# Altium footprint library 14-Inductors.PcbLib: 164 footprints (part 4 of 11)
Each footprint in its own frame and in the unit in brackets; x right, y up, seen from the top. Pads: shape width x height; smd on the part's side, far side on the other; paste and mask are expansions set on the pad; w line width, h text height; cw(c..) or ccw(c..) is an arc to the next point about the centre after c.
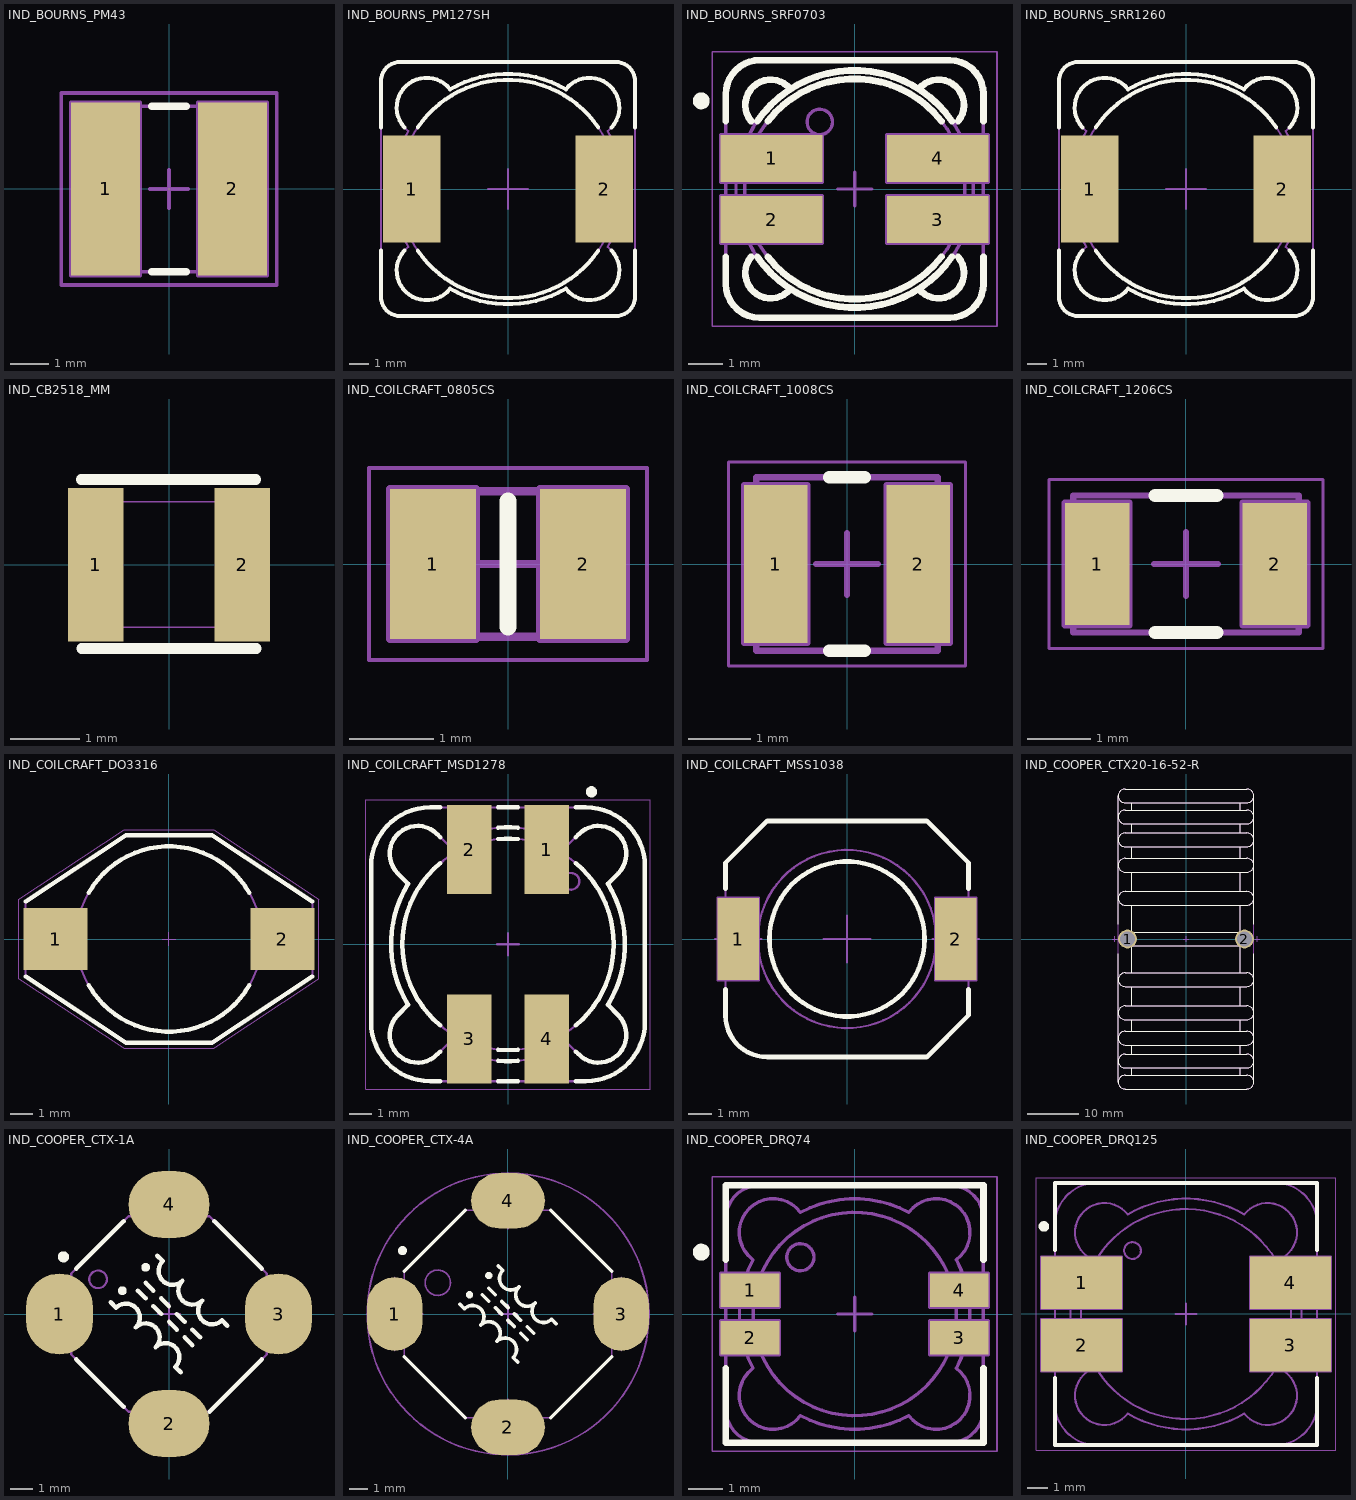
[diagram p3: the footprints below, top view; thin cyan lines are the x and y axes]

## IND_BOURNS_PM43 [mm] "SMD Inductor  Body Width 4.5mm Body Lenght 4mm Height 3.5mm"
height 3.5
pads (2):
  rect 1.8x4.5 smd: 1(-1.65,0) 2(1.65,0)
Top Overlay:
  lines w0.2: -0.45,-2.15 0.45,-2.15 ; -0.45,2.15 0.45,2.15
Mechanical 8:
  lines w0.1: -2.15,0 -1.65,0 ; -1.65,-0.5 -1.65,0 ; -1.65,0.5 -1.65,0 ; -1.15,0 -1.65,0 ; -0.5,0 0,0 ; 0,-0.5 0,0 ; 0,0.5 0,0 ; 0.5,0 0,0 ; 1.15,0 1.65,0 ; 1.65,-0.5 1.65,0 ; 1.65,0.5 1.65,0 ; 2.15,0 1.65,0 ; -2.55,-2.25 -0.75,-2.25 -0.75,2.25 -2.55,2.25 -2.55,-2.25 ; 0.75,-2.25 2.55,-2.25 2.55,2.25 0.75,2.25 0.75,-2.25
Mechanical 14:
  lines w0.1: -0.75,-2.15 -0.75,2.15 ; 0.75,-2.15 0.75,2.15 ; -2.381,-0.3 ccw(c0,0) -1.067,-2.15 1.067,-2.15 ccw(c0,0) 2.381,-0.3 2.1,-0.3 cw(c2.1,0) 2.1,0.3 2.381,0.3 ccw(c0,0) 1.067,2.15 -1.067,2.15 ccw(c0,0) -2.381,0.3 -2.1,0.3 cw(c-2.1,0) -2.1,-0.3 -2.381,-0.3
Mechanical 15:
  lines w0.1: -2.8,-2.5 -2.8,2.5 2.8,2.5 2.8,-2.5 -2.8,-2.5
3D body "IND_BOURNS_PM43.stp": height 3.5, standoff 0, extent -2.381,-2.15 2.381,2.15

## IND_BOURNS_PM127SH [mm] "SMD Inductor  Body Width 12.5mm Body Lenght 12.5mm Height 8mm"
height 8
pads (2):
  rect 2.9x5.4 smd: 1(-4.85,0) 2(4.85,0)
Top Overlay:
  lines w0.2: -6.4,-3.1 -6.4,-5.4 ccw(c-5.4,-5.4) -5.4,-6.4 5.4,-6.4 ccw(c5.4,-5.4) 6.4,-5.4 6.4,-3.1 ; -6.4,3.1 -6.4,5.4 cw(c-5.4,5.4) -5.4,6.4 5.4,6.4 cw(c5.4,5.4) 6.4,5.4 6.4,3.1 ; -5.218,-3.1 ccw(c-4.101,-4.101) -2.912,-5.016 ccw(c0,0) 2.912,-5.016 ccw(c4.101,-4.101) 5.218,-3.1 ; -5.218,3.1 cw(c-4.101,4.101) -2.912,5.016 cw(c0,0) 2.912,5.016 cw(c4.101,4.101) 5.218,3.1 ; -4.543,-3.1 ccw(c0,0) 4.543,-3.1 ; -4.543,3.1 cw(c0,0) 4.543,3.1
Mechanical 8:
  lines w0.1: -5.85,0 -4.85,0 ; -4.85,-1 -4.85,0 ; -4.85,1 -4.85,0 ; -3.85,0 -4.85,0 ; -1,0 0,0 ; 0,-1 0,0 ; 0,1 0,0 ; 1,0 0,0 ; 3.85,0 4.85,0 ; 4.85,-1 4.85,0 ; 4.85,1 4.85,0 ; 5.85,0 4.85,0
Mechanical 14:
  circle w0.1: c0,0 r5.5
  lines w0.1: -6.4,-5.4 ccw(c-5.4,-5.4) -5.4,-6.4 5.4,-6.4 ccw(c5.4,-5.4) 6.4,-5.4 6.4,5.4 ccw(c5.4,5.4) 5.4,6.4 -5.4,6.4 ccw(c-5.4,5.4) -6.4,5.4 -6.4,-5.4 ; -5.016,-2.912 cw(c0,0) -5.016,2.912 cw(c-4.101,4.101) -2.912,5.016 cw(c0,0) 2.912,5.016 cw(c4.101,4.101) 5.016,2.912 cw(c0,0) 5.016,-2.912 cw(c4.101,-4.101) 2.912,-5.016 cw(c0,0) -2.912,-5.016 cw(c-4.101,-4.101) -5.016,-2.912
3D body "IND_BOURNS_PM127SH.stp": height 8, standoff 0, extent -6.4,-6.4 6.4,6.4

## IND_BOURNS_SRF0703 [mm] "SMD Inductor  Body Width 7.6mm Body Lenght 7.6mm Height 3.6mm"
height 3.6
pads (4):
  rect 3x1.4 smd: 1(-2.45,0.9) 2(-2.45,-0.9) 3(2.45,-0.9) 4(2.45,0.9)
Top Overlay:
  circle w0.25: c-4.525,2.6 r0.125
  lines w0.2: -3.8,-2 -3.8,-2.8 ccw(c-2.8,-2.8) -2.8,-3.8 2.8,-3.8 ccw(c2.8,-2.8) 3.8,-2.8 3.8,-2 ; -3.8,2 -3.8,2.8 cw(c-2.8,2.8) -2.8,3.8 2.8,3.8 cw(c2.8,2.8) 3.8,2.8 3.8,2 ; -3.055,-2 ccw(c-2.475,-2.475) -1.891,-2.945 ; -3.055,2 cw(c-2.475,2.475) -1.891,2.945 ; -2.872,-2 ccw(c0,0) 2.872,-2 ; -2.872,2 cw(c0,0) 2.872,2 ; -2.562,-2 ccw(c0,0) 2.562,-2 ; -2.562,2 cw(c0,0) 2.562,2 ; 1.891,-2.945 ccw(c2.475,-2.475) 3.055,-2 ; 1.891,2.945 cw(c2.475,2.475) 3.055,2
Mechanical 8:
  lines w0.1: -2.95,-0.9 -2.45,-0.9 ; -2.95,0.9 -2.45,0.9 ; -2.45,-1.4 -2.45,-0.9 ; -2.45,-0.4 -2.45,-0.9 ; -2.45,0.4 -2.45,0.9 ; -2.45,1.4 -2.45,0.9 ; -1.95,-0.9 -2.45,-0.9 ; -1.95,0.9 -2.45,0.9 ; -0.5,0 0,0 ; 0,-0.5 0,0 ; 0,0.5 0,0 ; 0.5,0 0,0 ; 1.95,-0.9 2.45,-0.9 ; 1.95,0.9 2.45,0.9 ; 2.45,-1.4 2.45,-0.9 ; 2.45,-0.4 2.45,-0.9 ; 2.45,0.4 2.45,0.9 ; 2.45,1.4 2.45,0.9 ; 2.95,-0.9 2.45,-0.9 ; 2.95,0.9 2.45,0.9 ; -3.95,-1.6 -0.95,-1.6 -0.95,-0.2 -3.95,-0.2 -3.95,-1.6 ; -3.95,0.2 -0.95,0.2 -0.95,1.6 -3.95,1.6 -3.95,0.2 ; 0.95,-1.6 0.95,-0.2 3.95,-0.2 3.95,-1.6 0.95,-1.6 ; 0.95,0.2 0.95,1.6 3.95,1.6 3.95,0.2 0.95,0.2
Mechanical 14:
  circle w0.1: c0,0 r3.5
  circle w0.1: c0,0 r3.25
  circle w0.1: c-1.028,1.978 r0.375
  lines w0.1: -2.945,-1.891 ccw(c-2.475,-2.475) -1.891,-2.945 ; -2.945,1.891 cw(c-2.475,2.475) -1.891,2.945 ; 1.891,-2.945 ccw(c2.475,-2.475) 2.945,-1.891 ; 1.891,2.945 cw(c2.475,2.475) 2.945,1.891 ; -3.8,-2.8 ccw(c-2.8,-2.8) -2.8,-3.8 2.8,-3.8 ccw(c2.8,-2.8) 3.8,-2.8 3.8,2.8 ccw(c2.8,2.8) 2.8,3.8 -2.8,3.8 ccw(c-2.8,2.8) -3.8,2.8 -3.8,-2.8
Mechanical 15:
  lines w0.05: -4.2,-4.05 -4.2,4.05 4.2,4.05 4.2,-4.05 -4.2,-4.05
3D body "IND_BOURNS_SRF0703.stp": height 3.6, standoff 0, extent -3.8,-3.8 3.8,3.8

## IND_BOURNS_SRR1260 [mm] "SMD Inductor  Body Width 12.5mm Body Lenght 12.5mm Height 6.5mm"
height 6.5
pads (2):
  rect 2.9x5.4 smd: 1(-4.85,0) 2(4.85,0)
Top Overlay:
  lines w0.2: -6.4,-3.1 -6.4,-5.4 ccw(c-5.4,-5.4) -5.4,-6.4 5.4,-6.4 ccw(c5.4,-5.4) 6.4,-5.4 6.4,-3.1 ; -6.4,3.1 -6.4,5.4 cw(c-5.4,5.4) -5.4,6.4 5.4,6.4 cw(c5.4,5.4) 6.4,5.4 6.4,3.1 ; -5.218,-3.1 ccw(c-4.101,-4.101) -2.912,-5.016 ccw(c0,0) 2.912,-5.016 ccw(c4.101,-4.101) 5.218,-3.1 ; -5.218,3.1 cw(c-4.101,4.101) -2.912,5.016 cw(c0,0) 2.912,5.016 cw(c4.101,4.101) 5.218,3.1 ; -4.543,-3.1 ccw(c0,0) 4.543,-3.1 ; -4.543,3.1 cw(c0,0) 4.543,3.1
Mechanical 8:
  lines w0.1: -5.85,0 -4.85,0 ; -4.85,-1 -4.85,0 ; -4.85,1 -4.85,0 ; -3.85,0 -4.85,0 ; -1,0 0,0 ; 0,-1 0,0 ; 0,1 0,0 ; 1,0 0,0 ; 3.85,0 4.85,0 ; 4.85,-1 4.85,0 ; 4.85,1 4.85,0 ; 5.85,0 4.85,0
Mechanical 14:
  circle w0.1: c0,0 r5.5
  lines w0.1: -6.4,-5.4 ccw(c-5.4,-5.4) -5.4,-6.4 5.4,-6.4 ccw(c5.4,-5.4) 6.4,-5.4 6.4,5.4 ccw(c5.4,5.4) 5.4,6.4 -5.4,6.4 ccw(c-5.4,5.4) -6.4,5.4 -6.4,-5.4 ; -5.016,-2.912 ccw(c-4.101,-4.101) -2.912,-5.016 ccw(c0,0) 2.912,-5.016 ccw(c4.101,-4.101) 5.016,-2.912 ccw(c0,0) 5.016,2.912 ccw(c4.101,4.101) 2.912,5.016 ccw(c0,0) -2.912,5.016 ccw(c-4.101,4.101) -5.016,2.912 ccw(c0,0) -5.016,-2.912
3D body "IND_BOURNS_SRR1260.stp": height 6.5, standoff 0, extent -6.4,-6.4 6.4,6.4

## IND_CB2518_MM [mm] "IND_CB2518_MM"
height 6.5
pads (2):
  rect 0.8x2.2 smd: 1(-1.05,0) 2(1.05,0)
Top Overlay:
  lines w0.152: -1.255,1.219 1.245,1.219 ; -1.25,-1.203 1.25,-1.203
Mechanical 16:
  lines w0.025: -1.25,-0.9 -1.25,0.9 1.25,0.9 1.25,-0.9 -1.25,-0.9
3D body "ind_cb2518_mmpad.stp": height 0.01, standoff 0, extent -1.441,-1.1 -0.641,1.1
3D body "ind_cb2518_mmpad.stp": height 0.01, standoff 0, extent 0.667,-1.1 1.467,1.1
3D body "ind_cb2518_mm.stp": height 0.85, standoff 0, extent -1.25,-0.9 1.25,0.9

## IND_COILCRAFT_0805CS [mm] "SMD Inductor  Body Width 1.73mm Body Lenght 2.29mm Height 1.52mm, 0805CS Serie"
height 1.52
pads (2):
  rect 1.02x1.78 smd: 1(-0.89,0) 2(0.89,0)
Top Overlay:
  lines w0.2: 0,-0.75 0,0.75
Mechanical 8:
  lines w0.1: -1.39,0 -0.89,0 ; -0.89,-0.5 -0.89,0 ; -0.89,0.5 -0.89,0 ; -0.5,0 0,0 ; -0.39,0 -0.89,0 ; 0,-0.5 0,0 ; 0,0.5 0,0 ; 0.39,0 0.89,0 ; 0.5,0 0,0 ; 0.89,-0.5 0.89,0 ; 0.89,0.5 0.89,0 ; 1.39,0 0.89,0 ; -1.4,-0.89 -0.38,-0.89 -0.38,0.89 -1.4,0.89 -1.4,-0.89 ; 0.38,-0.89 1.4,-0.89 1.4,0.89 0.38,0.89 0.38,-0.89
Mechanical 14:
  lines w0.1: -1.145,-0.863 -1.145,0.863 1.145,0.863 1.145,-0.863 -1.145,-0.863
Mechanical 15:
  lines w0.05: -1.65,-1.14 1.65,-1.14 1.65,1.14 -1.65,1.14 -1.65,-1.14
3D body "IND_COILCRAFT_0805CS.stp": height 1.52, standoff 0, extent -1.144,-0.862 1.145,0.863

## IND_COILCRAFT_1008CS [mm] "SMD Inductor  Body Width 2.79m Body Lenght 2.92mm Height 2.03mm"
height 2.03
pads (2):
  rect 1.02x2.54 smd: 1(-1.145,0) 2(1.145,0)
Top Overlay:
  lines w0.2: -0.285,-1.395 0.285,-1.395 ; -0.285,1.395 0.285,1.395
Mechanical 8:
  lines w0.1: -1.645,0 -1.145,0 ; -1.145,-0.5 -1.145,0 ; -1.145,0.5 -1.145,0 ; -0.645,0 -1.145,0 ; -0.5,0 0,0 ; 0,-0.5 0,0 ; 0,0.5 0,0 ; 0.5,0 0,0 ; 0.645,0 1.145,0 ; 1.145,-0.5 1.145,0 ; 1.145,0.5 1.145,0 ; 1.645,0 1.145,0 ; -1.655,-1.27 -0.635,-1.27 -0.635,1.27 -1.655,1.27 -1.655,-1.27 ; 0.635,-1.27 1.655,-1.27 1.655,1.27 0.635,1.27 0.635,-1.27
Mechanical 14:
  lines w0.1: -1.46,-1.395 -1.46,1.395 1.46,1.395 1.46,-1.395 -1.46,-1.395
Mechanical 15:
  lines w0.05: -1.905,-1.645 1.905,-1.645 1.905,1.645 -1.905,1.645 -1.905,-1.645
3D body "IND_COILCRAFT_1008CS.stp": height 2.18, standoff 0, extent -1.46,-1.395 1.46,1.395

## IND_COILCRAFT_1206CS [mm] "SMD Inductor  Body Width 2.16mm Body Lenght 3.56mm Height 1.52mm, 1206CS Serie"
height 1.52
pads (2):
  rect 1.02x1.93 smd: 1(-1.4,0) 2(1.4,0)
Top Overlay:
  lines w0.2: -0.49,-1.08 0.49,-1.08 ; -0.49,1.08 0.49,1.08
Mechanical 8:
  lines w0.1: -1.9,0 -1.4,0 ; -1.4,-0.5 -1.4,0 ; -1.4,0.5 -1.4,0 ; -0.9,0 -1.4,0 ; -0.5,0 0,0 ; 0,-0.5 0,0 ; 0,0.5 0,0 ; 0.5,0 0,0 ; 0.9,0 1.4,0 ; 1.4,-0.5 1.4,0 ; 1.4,0.5 1.4,0 ; 1.9,0 1.4,0 ; -1.91,-0.965 -1.91,0.965 -0.89,0.965 -0.89,-0.965 -1.91,-0.965 ; 0.89,-0.965 0.89,0.965 1.91,0.965 1.91,-0.965 0.89,-0.965
Mechanical 14:
  lines w0.1: -1.78,-1.08 -1.78,1.08 1.78,1.08 1.78,-1.08 -1.78,-1.08
Mechanical 15:
  lines w0.05: -2.16,-1.33 -2.16,1.33 2.16,1.33 2.16,-1.33 -2.16,-1.33
3D body "IND_COILCRAFT_1206CS.stp": height 1.51, standoff 0, extent -1.78,-1.08 1.78,1.08

## IND_COILCRAFT_DO3316 [mm] "SMD Inductor  Body Width 9.4mm Body Lenght 12.95mm Height 5.21mm"
height 5.21
pads (2):
  rect 2.92x2.79 smd: 1(-5.145,0) 2(5.145,0)
Top Overlay:
  lines w0.2: -6.5,-1.7 -1.95,-4.7 1.95,-4.7 6.5,-1.7 ; -6.5,1.7 -1.95,4.7 1.95,4.7 6.5,1.7 ; -3.637,-2.1 ccw(c0,0) 3.637,-2.1 ; -3.637,2.1 cw(c0,0) 3.637,2.1
Mechanical 14:
  circle w0.1: c0,0 r4.2
  lines w0.1: -6.5,-1.7 -6.5,1.7 -1.95,4.7 1.95,4.7 6.5,1.7 6.5,-1.7 1.95,-4.7 -1.95,-4.7 -6.5,-1.7
Mechanical 15:
  lines w0.05: -0.3,0 0.3,0 ; 0,-0.3 0,0.3 ; -6.8,-1.802 -6.8,1.802 -2.025,4.95 2.025,4.95 6.8,1.802 6.8,-1.802 2.025,-4.95 -2.025,-4.95 -6.8,-1.802
3D body "IND_COILCRAFT_DO3316.stp": height 5.2, standoff 0, extent -6.475,-4.7 6.475,4.7

## IND_COILCRAFT_MSD1278 [mm] "SMD Inductor  Body Width 12.3mm Body Lenght 12.3mm Height 8.05mm"
height 8.05
pads (4):
  rect 2x4 smd: 1(1.75,4.25) 2(-1.75,4.25) 3(-1.75,-4.25) 4(1.75,-4.25)
Top Overlay:
  circle w0.25: c3.75,6.85 r0.125
  lines w0.2: -3.05,-6.15 -3.5,-6.15 cw(c-3.5,-3.5) -6.15,-3.5 -6.15,3.5 cw(c-3.5,3.5) -3.5,6.15 -3.05,6.15 ; -3.05,-4.818 -3.182,-4.95 cw(c-4.066,-4.066) -4.95,-3.182 -4.489,-2.722 cw(c0,0) -4.489,2.722 -4.95,3.182 cw(c-4.066,4.066) -3.182,4.95 -3.05,4.818 ; -3.05,-3.641 cw(c0,0) -3.05,3.641 ; -0.45,-6.15 0.45,-6.15 ; -0.45,-5.231 ccw(c0,0) 0.45,-5.231 ; -0.45,-4.729 ccw(c0,0) 0.45,-4.729 ; -0.45,4.729 cw(c0,0) 0.45,4.729 ; -0.45,5.231 cw(c0,0) 0.45,5.231 ; -0.45,6.15 0.45,6.15 ; 3.05,-6.15 3.5,-6.15 ccw(c3.5,-3.5) 6.15,-3.5 6.15,3.5 ccw(c3.5,3.5) 3.5,6.15 3.05,6.15 ; 3.05,-4.818 3.182,-4.95 ccw(c4.066,-4.066) 4.95,-3.182 4.489,-2.722 ccw(c0,0) 4.489,2.722 4.95,3.182 ccw(c4.066,4.066) 3.182,4.95 3.05,4.818 ; 3.05,-3.641 ccw(c0,0) 3.05,3.641
Mechanical 8:
  lines w0.1: -2.25,-4.25 -1.75,-4.25 ; -2.25,4.25 -1.75,4.25 ; -1.75,-4.75 -1.75,-4.25 ; -1.75,-3.75 -1.75,-4.25 ; -1.75,3.75 -1.75,4.25 ; -1.75,4.75 -1.75,4.25 ; -1.25,-4.25 -1.75,-4.25 ; -1.25,4.25 -1.75,4.25 ; -0.5,0 0,0 ; 0,-0.5 0,0 ; 0,0.5 0,0 ; 0.5,0 0,0 ; 1.25,-4.25 1.75,-4.25 ; 1.25,4.25 1.75,4.25 ; 1.75,-4.75 1.75,-4.25 ; 1.75,-3.75 1.75,-4.25 ; 1.75,3.75 1.75,4.25 ; 1.75,4.75 1.75,4.25 ; 2.25,-4.25 1.75,-4.25 ; 2.25,4.25 1.75,4.25
Mechanical 14:
  circle w0.1: c0,0 r4.75
  circle w0.1: c2.828,2.828 r0.375
  lines w0.1: -6.15,-3.5 ccw(c-3.5,-3.5) -3.5,-6.15 3.5,-6.15 ccw(c3.5,-3.5) 6.15,-3.5 6.15,3.5 ccw(c3.5,3.5) 3.5,6.15 -3.5,6.15 ccw(c-3.5,3.5) -6.15,3.5 -6.15,-3.5 ; -4.95,-3.182 ccw(c-4.066,-4.066) -3.182,-4.95 -2.722,-4.489 ccw(c0,0) 2.722,-4.489 3.182,-4.95 ccw(c4.066,-4.066) 4.95,-3.182 4.489,-2.722 ccw(c0,0) 4.489,2.722 4.95,3.182 ccw(c4.066,4.066) 3.182,4.95 2.722,4.489 ccw(c0,0) -2.722,4.489 -3.182,4.95 ccw(c-4.066,4.066) -4.95,3.182 -4.489,2.722 ccw(c0,0) -4.489,-2.722 -4.95,-3.182
Mechanical 15:
  lines w0.05: -6.4,-6.5 6.4,-6.5 6.4,6.5 -6.4,6.5 -6.4,-6.5
3D body "IND_COILCRAFT_MSD1278.stp": height 8.05, standoff 0, extent -6.15,-6.15 6.15,6.15

## IND_COILCRAFT_MSS1038 [mm] "SMD Inductor  Body Width 10mm Body Lenght 10.2mm Height 4mm"
height 4
pads (2):
  rect 1.78x3.56 smd: 1(-4.7,0) 2(4.7,0)
Top Overlay:
  circle w0.2: c0,0 r3.35
  lines w0.2: -5.25,-2.18 -5.25,-3.3 ccw(c-3.45,-3.3) -3.45,-5.1 3.45,-5.1 5.25,-3.3 5.25,-2.18 ; -5.25,2.18 -5.25,3.3 -3.45,5.1 3.45,5.1 5.25,3.3 5.25,2.18
Mechanical 8:
  lines w0.1: -5.7,0 -4.7,0 ; -4.7,-1 -4.7,0 ; -4.7,1 -4.7,0 ; -3.7,0 -4.7,0 ; -1,0 0,0 ; 0,-1 0,0 ; 0,1 0,0 ; 1,0 0,0 ; 3.7,0 4.7,0 ; 4.7,-1 4.7,0 ; 4.7,1 4.7,0 ; 5.7,0 4.7,0 ; -5.59,-1.78 -3.81,-1.78 -3.81,1.78 -5.59,1.78 -5.59,-1.78 ; 3.81,-1.78 5.59,-1.78 5.59,1.78 3.81,1.78 3.81,-1.78
Mechanical 14:
  circle w0.1: c0,0 r3.85
  circle w0.1: c0,0 r3.35
  lines w0.1: -5.25,-1.6 -5.25,1.6 ; -5.25,-1.6 -5.25,-3.3 ccw(c-3.45,-3.3) -3.45,-5.1 3.45,-5.1 5.25,-3.3 5.25,-1.6 ; -5.25,-1.6 -3.85,-1.6 -3.85,1.6 -5.25,1.6 ; -5.25,1.6 -5.25,3.3 -3.45,5.1 3.45,5.1 5.25,3.3 5.25,1.6 ; 5.25,-1.6 5.25,1.6 ; 5.25,-1.6 3.85,-1.6 3.85,1.6 5.25,1.6
3D body "IND_COILCRAFT_MSS1038.stp": height 4, standoff 0, extent -5.25,-5.1 5.25,5.1

## IND_COOPER_CTX20-16-52-R [mm] "Vertical Leaded Toroidal Inductor Lead Spacing 23mm D59mm x W28mm"
height 59
pads (2):
  round 3.7 hole 3: 1(-11.5,0) 2(11.5,0)
Top Overlay:
  lines w0.2: -13.325,-28.15 -13.325,-2.923 ; -13.325,2.923 -13.325,28.15 ; -11.321,-1.35 11.321,-1.35 ; -11.321,1.35 11.321,1.35 ; -10.625,-26.8 -10.625,-25.35 ; -10.625,-22.65 -10.625,-20.85 ; -10.625,-18.15 -10.625,-15.85 ; -10.625,-13.15 -10.625,-9.35 ; -10.625,-6.65 -10.625,-1.35 ; -10.625,1.35 -10.625,6.65 ; -10.625,9.35 -10.625,13.15 ; -10.625,15.85 -10.625,18.15 ; -10.625,20.85 -10.625,22.65 ; -10.625,25.35 -10.625,26.8 ; 10.625,-26.8 10.625,-25.35 ; 10.625,-22.65 10.625,-20.85 ; 10.625,-18.15 10.625,-15.85 ; 10.625,-13.15 10.625,-9.35 ; 10.625,-6.65 10.625,-1.35 ; 10.625,1.35 10.625,6.65 ; 10.625,9.35 10.625,13.15 ; 10.625,15.85 10.625,18.15 ; 10.625,20.85 10.625,22.65 ; 10.625,25.35 10.625,26.8 ; 13.325,-28.15 13.325,-2.923 ; 13.325,2.923 13.325,28.15 ; -11.975,-29.5 cw(c-11.975,-28.15) -11.975,-26.8 11.975,-26.8 cw(c11.975,-28.15) 11.975,-29.5 -11.975,-29.5 ; -11.975,-25.35 cw(c-11.975,-24) -11.975,-22.65 11.975,-22.65 cw(c11.975,-24) 11.975,-25.35 -11.975,-25.35 ; -11.975,-20.85 cw(c-11.975,-19.5) -11.975,-18.15 11.975,-18.15 cw(c11.975,-19.5) 11.975,-20.85 -11.975,-20.85 ; -11.975,-15.85 cw(c-11.975,-14.5) -11.975,-13.15 11.975,-13.15 cw(c11.975,-14.5) 11.975,-15.85 -11.975,-15.85 ; -11.975,-9.35 cw(c-11.975,-8) -11.975,-6.65 11.975,-6.65 cw(c11.975,-8) 11.975,-9.35 -11.975,-9.35 ; -11.975,6.65 cw(c-11.975,8) -11.975,9.35 11.975,9.35 cw(c11.975,8) 11.975,6.65 -11.975,6.65 ; -11.975,13.15 cw(c-11.975,14.5) -11.975,15.85 11.975,15.85 cw(c11.975,14.5) 11.975,13.15 -11.975,13.15 ; -11.975,18.15 cw(c-11.975,19.5) -11.975,20.85 11.975,20.85 cw(c11.975,19.5) 11.975,18.15 -11.975,18.15 ; -11.975,22.65 cw(c-11.975,24) -11.975,25.35 11.975,25.35 cw(c11.975,24) 11.975,22.65 -11.975,22.65 ; -11.975,26.8 cw(c-11.975,28.15) -11.975,29.5 11.975,29.5 cw(c11.975,28.15) 11.975,26.8 -11.975,26.8
Mechanical 8:
  lines w0.1: -14.5,0 -14,0 ; -14,-0.5 -14,0 ; -14,0.5 -14,0 ; -13.5,0 -14,0 ; -0.5,0 0,0 ; 0,-0.5 0,0 ; 0,0.5 0,0 ; 0.5,0 0,0 ; 13.5,0 14,0 ; 14,-0.5 14,0 ; 14,0.5 14,0 ; 14.5,0 14,0
Mechanical 14:
  lines w0.1: -13.325,-28.15 -13.325,28.15 ; -10.625,-26.8 -10.625,-25.35 ; -10.625,-22.65 -10.625,-20.85 ; -10.625,-18.15 -10.625,-15.85 ; -10.625,-13.15 -10.625,-9.35 ; -10.625,-6.65 -10.625,-1.35 ; -10.625,1.35 -10.625,6.65 ; -10.625,9.35 -10.625,13.15 ; -10.625,15.85 -10.625,18.15 ; -10.625,20.85 -10.625,22.65 ; -10.625,25.35 -10.625,26.8 ; 10.625,-26.8 10.625,-25.35 ; 10.625,-22.65 10.625,-20.85 ; 10.625,-18.15 10.625,-15.85 ; 10.625,-13.15 10.625,-9.35 ; 10.625,-6.65 10.625,-1.35 ; 10.625,1.35 10.625,6.65 ; 10.625,9.35 10.625,13.15 ; 10.625,15.85 10.625,18.15 ; 10.625,20.85 10.625,22.65 ; 10.625,25.35 10.625,26.8 ; 13.325,-28.15 13.325,28.15 ; -11.975,-29.5 cw(c-11.975,-28.15) -11.975,-26.8 11.975,-26.8 cw(c11.975,-28.15) 11.975,-29.5 -11.975,-29.5 ; -11.975,-25.35 cw(c-11.975,-24) -11.975,-22.65 11.975,-22.65 cw(c11.975,-24) 11.975,-25.35 -11.975,-25.35 ; -11.975,-20.85 cw(c-11.975,-19.5) -11.975,-18.15 11.975,-18.15 cw(c11.975,-19.5) 11.975,-20.85 -11.975,-20.85 ; -11.975,-15.85 cw(c-11.975,-14.5) -11.975,-13.15 11.975,-13.15 cw(c11.975,-14.5) 11.975,-15.85 -11.975,-15.85 ; -11.975,-9.35 cw(c-11.975,-8) -11.975,-6.65 11.975,-6.65 cw(c11.975,-8) 11.975,-9.35 -11.975,-9.35 ; -11.975,-1.35 cw(c-11.975,0) -11.975,1.35 11.975,1.35 cw(c11.975,0) 11.975,-1.35 -11.975,-1.35 ; -11.975,6.65 cw(c-11.975,8) -11.975,9.35 11.975,9.35 cw(c11.975,8) 11.975,6.65 -11.975,6.65 ; -11.975,13.15 cw(c-11.975,14.5) -11.975,15.85 11.975,15.85 cw(c11.975,14.5) 11.975,13.15 -11.975,13.15 ; -11.975,18.15 cw(c-11.975,19.5) -11.975,20.85 11.975,20.85 cw(c11.975,19.5) 11.975,18.15 -11.975,18.15 ; -11.975,22.65 cw(c-11.975,24) -11.975,25.35 11.975,25.35 cw(c11.975,24) 11.975,22.65 -11.975,22.65 ; -11.975,26.8 cw(c-11.975,28.15) -11.975,29.5 11.975,29.5 cw(c11.975,28.15) 11.975,26.8 -11.975,26.8
3D body "IND_COOPER_CTX20-16-52-R.stp": height 59, standoff -3.8, extent -14,-29.5 14,29.5

## IND_COOPER_CTX-1A [mm] "Dual Winding Shielded Power Inductor/Transformer CTX OCTA-PAC?PLUS Serie"
height 4.19
pads (4):
  oval 3.04x3.68 smd: 1(-4.98,0) 3(4.98,0)
  oval 3.68x3.04 smd: 2(0,-4.98) 4(0,4.98)
Top Overlay:
  circle w0.25: c-4.8,2.6 r0.125
  circle w0.2: c-2.121,1.061 r0.1
  circle w0.2: c-1.061,2.121 r0.1
  lines w0.2: -2.652,0.53 -2.408,0.286 cw(c-1.959,-0.163) -1.51,-0.612 cw(c-1.061,-1.061) -0.612,-1.51 cw(c-0.163,-1.959) 0.286,-2.408 0.53,-2.652 ; -1.414,1.061 -1.061,0.707 ; -1.061,1.414 -0.707,1.061 ; -0.707,0.354 -0.354,0 ; -0.53,2.652 -0.286,2.408 ccw(c0.163,1.959) 0.612,1.51 ccw(c1.061,1.061) 1.51,0.612 ccw(c1.959,0.163) 2.408,-0.286 2.652,-0.53 ; -0.354,0.707 0,0.354 ; 0,-0.354 0.354,-0.707 ; 0.354,0 0.707,-0.354 ; 0.707,-1.061 1.061,-1.414 ; 1.061,-0.707 1.414,-1.061 ; -4.225,2.06 -2.06,4.225 -4.225,2.06 ; -4.225,-2.06 -2.06,-4.225 -4.225,-2.06 ; 1.84,-4.445 4.225,-2.06 1.84,-4.445 ; 2.06,4.225 4.225,2.06 2.06,4.225
Mechanical 8:
  lines w0.1: -4.98,0 -4.98,-0.5 -4.98,0 ; -4.98,0 -4.48,0 -4.98,0 ; -4.98,0 -4.98,0.5 -4.98,0 ; -4.98,0 -5.48,0 -4.98,0 ; 0,-4.98 -0.5,-4.98 0,-4.98 ; 0,-4.98 0,-5.48 0,-4.98 ; 0,-4.98 0.5,-4.98 0,-4.98 ; 0,-4.98 0,-4.48 0,-4.98 ; 0,0 -0.5,0 0,0 ; 0,0 0,-0.5 0,0 ; 0,0 0.5,0 0,0 ; 0,0 0,0.5 0,0 ; 0,4.98 -0.5,4.98 0,4.98 ; 0,4.98 0,4.48 0,4.98 ; 0,4.98 0.5,4.98 0,4.98 ; 0,4.98 0,5.48 0,4.98 ; 4.98,0 4.98,-0.5 4.98,0 ; 4.98,0 5.48,0 4.98,0 ; 4.98,0 4.98,0.5 4.98,0 ; 4.98,0 4.48,0 4.98,0
Mechanical 14:
  circle w0.1: c-2.121,1.061 r0.1
  circle w0.1: c-1.061,2.121 r0.1
  circle w0.1: c-3.225,1.575 r0.4
  lines w0.1: -2.652,0.53 -2.408,0.286 cw(c-1.959,-0.163) -1.51,-0.612 cw(c-1.061,-1.061) -0.612,-1.51 cw(c-0.163,-1.959) 0.286,-2.408 0.53,-2.652 ; -1.414,1.061 -1.061,0.707 ; -1.061,1.414 -0.707,1.061 ; -0.707,0.354 -0.354,0 ; -0.53,2.652 -0.286,2.408 ccw(c0.163,1.959) 0.612,1.51 ccw(c1.061,1.061) 1.51,0.612 ccw(c1.959,0.163) 2.408,-0.286 2.652,-0.53 ; -0.354,0.707 0,0.354 ; 0,-0.354 0.354,-0.707 ; 0.354,0 0.707,-0.354 ; 0.707,-1.061 1.061,-1.414 ; 1.061,-0.707 1.414,-1.061 ; -5.715,-0.6 -5.715,0.6 ; -5.715,-0.6 -4.445,-0.6 ; -5.715,-0.6 -5.715,0.6 ; -5.715,-0.6 -4.445,-0.6 ; -5.715,0.6 -4.445,0.6 ; -5.715,0.6 -4.445,0.6 ; -4.445,-1.84 -1.84,-4.445 ; -4.445,-1.84 -4.445,1.84 ; -4.445,-1.84 -1.84,-4.445 ; -4.445,-1.84 -4.445,1.84 ; -4.445,-0.6 -4.445,0.6 ; -4.445,-0.6 -4.445,0.6 ; -4.445,1.84 -1.84,4.445 ; -4.445,1.84 -1.84,4.445 ; -1.84,-4.445 1.84,-4.445 ; -1.84,-4.445 1.84,-4.445 ; -1.84,4.445 1.84,4.445 ; -1.84,4.445 1.84,4.445 ; -0.6,-5.715 0.6,-5.715 ; -0.6,-5.715 -0.6,-4.445 ; -0.6,-5.715 0.6,-5.715 ; -0.6,-5.715 -0.6,-4.445 ; -0.6,-4.445 0.6,-4.445 ; -0.6,-4.445 0.6,-4.445 ; -0.6,4.445 -0.6,5.715 ; -0.6,4.445 0.6,4.445 ; -0.6,4.445 -0.6,5.715 ; -0.6,4.445 0.6,4.445 ; -0.6,5.715 0.6,5.715 ; -0.6,5.715 0.6,5.715 ; 0.6,-5.715 0.6,-4.445 ; 0.6,-5.715 0.6,-4.445 ; 0.6,4.445 0.6,5.715 ; 0.6,4.445 0.6,5.715 ; 1.84,-4.445 4.445,-1.84 ; 1.84,-4.445 4.445,-1.84 ; 1.84,4.445 4.445,1.84 ; 1.84,4.445 4.445,1.84 ; 4.445,-1.84 4.445,1.84 ; 4.445,-1.84 4.445,1.84 ; 4.445,-0.6 4.445,0.6 ; 4.445,-0.6 5.715,-0.6 ; 4.445,-0.6 4.445,0.6 ; 4.445,-0.6 5.715,-0.6 ; 4.445,0.6 5.715,0.6 ; 4.445,0.6 5.715,0.6 ; 5.715,-0.6 5.715,0.6 ; 5.715,-0.6 5.715,0.6
  text "1" at -3.825,-0.575 h1.2
  text "2" at -0.425,-4 h1.2
  text "4" at -0.425,2.75 h1.2
  text "3" at 3.225,-0.65 h1.2
3D body "IND_COOPER_CTX-1A.stp": height 4.19, standoff 0, extent -5.715,-5.715 5.715,5.715

## IND_COOPER_CTX-4A [mm] "Dual Winding Shielded Power Inductor/Transformer CTX OCTA-PAC?PLUS Serie"
height 6.35
pads (4):
  oval 3.05x4.06 smd: 1(-6.25,0) 3(6.25,0)
  oval 4.06x3.05 smd: 2(0,-6.25) 4(0,6.25)
Top Overlay:
  circle w0.2: c-1.061,2.121 r0.1
  circle w0.2: c-2.121,1.061 r0.1
  circle w0.25: c-5.825,3.5 r0.125
  lines w0.2: -5.722,-2.36 -2.36,-5.722 ; -5.722,2.36 -2.36,5.722 ; -2.652,0.53 -2.408,0.286 cw(c-1.959,-0.163) -1.51,-0.612 cw(c-1.061,-1.061) -0.612,-1.51 cw(c-0.163,-1.959) 0.286,-2.408 0.53,-2.652 ; -1.414,1.061 -1.061,0.707 ; -1.061,1.414 -0.707,1.061 ; -0.707,0.354 -0.354,0 ; -0.53,2.652 -0.286,2.408 ccw(c0.163,1.959) 0.612,1.51 ccw(c1.061,1.061) 1.51,0.612 ccw(c1.959,0.163) 2.408,-0.286 2.652,-0.53 ; -0.354,0.707 0,0.354 ; 0,-0.354 0.354,-0.707 ; 0.354,0 0.707,-0.354 ; 0.707,-1.061 1.061,-1.414 ; 1.061,-0.707 1.414,-1.061 ; 2.36,-5.722 5.722,-2.36 ; 2.36,5.722 5.722,2.36
Mechanical 8:
  lines w0.1: -7.775,0 -4.725,0 -6.25,0 ; -6.25,-2.03 -6.25,0 ; -6.25,2.03 -6.25,0 ; -2.03,6.25 0,6.25 ; -0.5,0 0,0 ; 0,-7.775 0,-6.25 ; 0,-4.725 0,-6.25 ; 0,-0.5 0,0 ; 0,0.5 0,0 ; 0,4.725 0,6.25 ; 0,7.775 0,6.25 ; 0.5,0 0,0 ; 2.03,-6.25 -2.03,-6.25 0,-6.25 ; 2.03,6.25 0,6.25 ; 4.725,0 6.25,0 ; 6.25,-2.03 6.25,0 ; 6.25,2.03 6.25,0 ; 7.775,0 6.25,0
Mechanical 14:
  circle w0.1: c-3.875,1.725 r0.7
  circle w0.1: c-1.061,2.121 r0.1
  circle w0.1: c-2.121,1.061 r0.1
  lines w0.1: -5.722,-1.18 -7.285,-1.18 -7.285,1.18 -5.722,1.18 ; -2.652,0.53 -2.408,0.286 cw(c-1.959,-0.163) -1.51,-0.612 cw(c-1.061,-1.061) -0.612,-1.51 cw(c-0.163,-1.959) 0.286,-2.408 0.53,-2.652 ; -1.414,1.061 -1.061,0.707 ; -1.18,-5.722 -1.18,-7.285 1.18,-7.285 1.18,-5.722 ; -1.18,5.722 -1.18,7.285 1.18,7.285 1.18,5.722 ; -1.061,1.414 -0.707,1.061 ; -0.707,0.354 -0.354,0 ; -0.53,2.652 -0.286,2.408 ccw(c0.163,1.959) 0.612,1.51 ccw(c1.061,1.061) 1.51,0.612 ccw(c1.959,0.163) 2.408,-0.286 2.652,-0.53 ; -0.354,0.707 0,0.354 ; 0,-0.354 0.354,-0.707 ; 0.354,0 0.707,-0.354 ; 0.707,-1.061 1.061,-1.414 ; 1.061,-0.707 1.414,-1.061 ; 5.722,-1.18 7.285,-1.18 7.285,1.18 5.722,1.18 ; -5.722,-2.36 -2.36,-5.722 2.36,-5.722 5.722,-2.36 5.722,2.36 2.36,5.722 -2.36,5.722 -5.722,2.36 -5.722,-2.36
  text "3" at 3.225,-0.65 h1.2
  text "4" at -0.425,2.75 h1.2
  text "2" at -0.425,-4 h1.2
  text "1" at -3.825,-0.575 h1.2
Mechanical 15:
  circle w0.1: c0,0 r7.775
3D body "IND_COOPER_CTX-4A.stp": height 6.35, standoff 0, extent -7.285,-7.285 7.285,7.285

## IND_COOPER_DRQ74 [mm] "Dual Winding Shielded Inductor/Transformer DRQ Serie"
height 4.45
pads (4):
  rect 1.73x1 smd: 1(-3.085,0.7) 2(-3.085,-0.7) 3(3.085,-0.7) 4(3.085,0.7)
Top Overlay:
  circle w0.25: c-4.525,1.825 r0.125
  lines w0.2: -3.8,-1.6 -3.8,-3.8 3.8,-3.8 3.8,-1.6 ; -3.8,1.6 -3.8,3.8 3.8,3.8 3.8,1.6
Mechanical 8:
  lines w0.1: -3.585,-0.7 -3.085,-0.7 ; -3.585,0.7 -3.085,0.7 ; -3.085,-1.2 -3.085,-0.7 ; -3.085,-0.2 -3.085,-0.7 ; -3.085,0.2 -3.085,0.7 ; -3.085,1.2 -3.085,0.7 ; -2.585,-0.7 -3.085,-0.7 ; -2.585,0.7 -3.085,0.7 ; -0.5,0 0,0 ; 0,-0.5 0,0 ; 0,0.5 0,0 ; 0.5,0 0,0 ; 2.585,-0.7 3.085,-0.7 ; 2.585,0.7 3.085,0.7 ; 3.085,-1.2 3.085,-0.7 ; 3.085,-0.2 3.085,-0.7 ; 3.085,0.2 3.085,0.7 ; 3.085,1.2 3.085,0.7 ; 3.585,-0.7 3.085,-0.7 ; 3.585,0.7 3.085,0.7 ; -3.95,-1.2 -3.95,-0.2 -2.22,-0.2 -2.22,-1.2 -3.95,-1.2 ; -3.95,0.2 -3.95,1.2 -2.22,1.2 -2.22,0.2 -3.95,0.2 ; 2.22,-1.2 2.22,-0.2 3.95,-0.2 3.95,-1.2 2.22,-1.2 ; 2.22,0.2 2.22,1.2 3.95,1.2 3.95,0.2 2.22,0.2
Mechanical 14:
  circle w0.1: c-1.6,1.675 r0.4
  circle w0.1: c0,0 r3
  lines w0.1: -3.8,-2.8 ccw(c-2.8,-2.8) -2.8,-3.8 2.8,-3.8 ccw(c2.8,-2.8) 3.8,-2.8 3.8,2.8 ccw(c2.8,2.8) 2.8,3.8 -2.8,3.8 ccw(c-2.8,2.8) -3.8,2.8 -3.8,-2.8 ; -3,-1.601 cw(c0,0) -3,1.601 cw(c-2.404,2.404) -1.601,3 cw(c0,0) 1.601,3 cw(c2.404,2.404) 3,1.601 cw(c0,0) 3,-1.601 cw(c2.404,-2.404) 1.601,-3 cw(c0,0) -1.601,-3 cw(c-2.404,-2.404) -3,-1.601
Mechanical 15:
  lines w0.05: -4.2,-4.05 4.2,-4.05 4.2,4.05 -4.2,4.05 -4.2,-4.05
3D body "IND_COOPER_DRQ74.stp": height 4.45, standoff 0, extent -3.8,-3.8 3.8,3.8

## IND_COOPER_DRQ125 [mm] "Dual Winding Shielded Inductor/Transformer DRQ Serie"
height 6
pads (4):
  rect 3.85x2.5 smd: 1(-4.975,1.5) 2(-4.975,-1.5) 3(4.975,-1.5) 4(4.975,1.5)
Top Overlay:
  circle w0.25: c-6.775,4.175 r0.125
  lines w0.2: -6.25,-3.05 -6.25,-6.25 6.25,-6.25 6.25,-3.05 ; -6.25,3.05 -6.25,6.25 6.25,6.25 6.25,3.05
Mechanical 8:
  lines w0.1: -5.475,-1.5 -4.975,-1.5 ; -5.475,1.5 -4.975,1.5 ; -4.975,-2 -4.975,-1.5 ; -4.975,-1 -4.975,-1.5 ; -4.975,1 -4.975,1.5 ; -4.975,2 -4.975,1.5 ; -4.475,-1.5 -4.975,-1.5 ; -4.475,1.5 -4.975,1.5 ; -0.5,0 0,0 ; 0,-0.5 0,0 ; 0,0.5 0,0 ; 0.5,0 0,0 ; 4.475,1.5 4.975,1.5 ; 4.975,1 4.975,1.5 ; 4.975,2 4.975,1.5 ; 5.475,1.5 4.975,1.5 ; -6.9,-2.75 -6.9,-0.25 -3.05,-0.25 -3.05,-2.75 -6.9,-2.75 ; -6.9,0.25 -6.9,2.75 -3.05,2.75 -3.05,0.25 -6.9,0.25 ; 3.05,-2.75 3.05,-0.25 6.9,-0.25 6.9,-2.75 3.05,-2.75 ; 3.05,0.25 3.05,2.75 6.9,2.75 6.9,0.25 3.05,0.25
Mechanical 14:
  circle w0.1: c-2.55,3.025 r0.4
  circle w0.1: c0,0 r5
  lines w0.1: -4.25,6.25 ccw(c-4.25,4.25) -6.25,4.25 -6.25,-4.25 ccw(c-4.25,-4.25) -4.25,-6.25 4.25,-6.25 ccw(c4.25,-4.25) 6.25,-4.25 6.25,4.25 ccw(c4.25,4.25) 4.25,6.25 ; -4.25,6.25 4.25,6.25 ; -4.25,6.25 4.25,6.25 ; -4.745,-2.781 cw(c0,0) -4.745,2.781 cw(c-3.889,3.889) -2.781,4.745 cw(c0,0) 2.781,4.745 cw(c3.889,3.889) 4.745,2.781 cw(c0,0) 4.745,-2.781 cw(c3.889,-3.889) 2.781,-4.745 cw(c0,0) -2.781,-4.745 cw(c-3.889,-3.889) -4.745,-2.781
Mechanical 15:
  lines w0.05: -7.15,-6.5 -7.15,6.5 7.15,6.5 7.15,-6.5 -7.15,-6.5
3D body "IND_COOPER_DRQ125.stp": height 6, standoff 0, extent -6.25,-6.25 6.25,6.25